# Altium schematic symbol library lib_datalogger.SchLib: 1246 symbols (part 8 of 16)
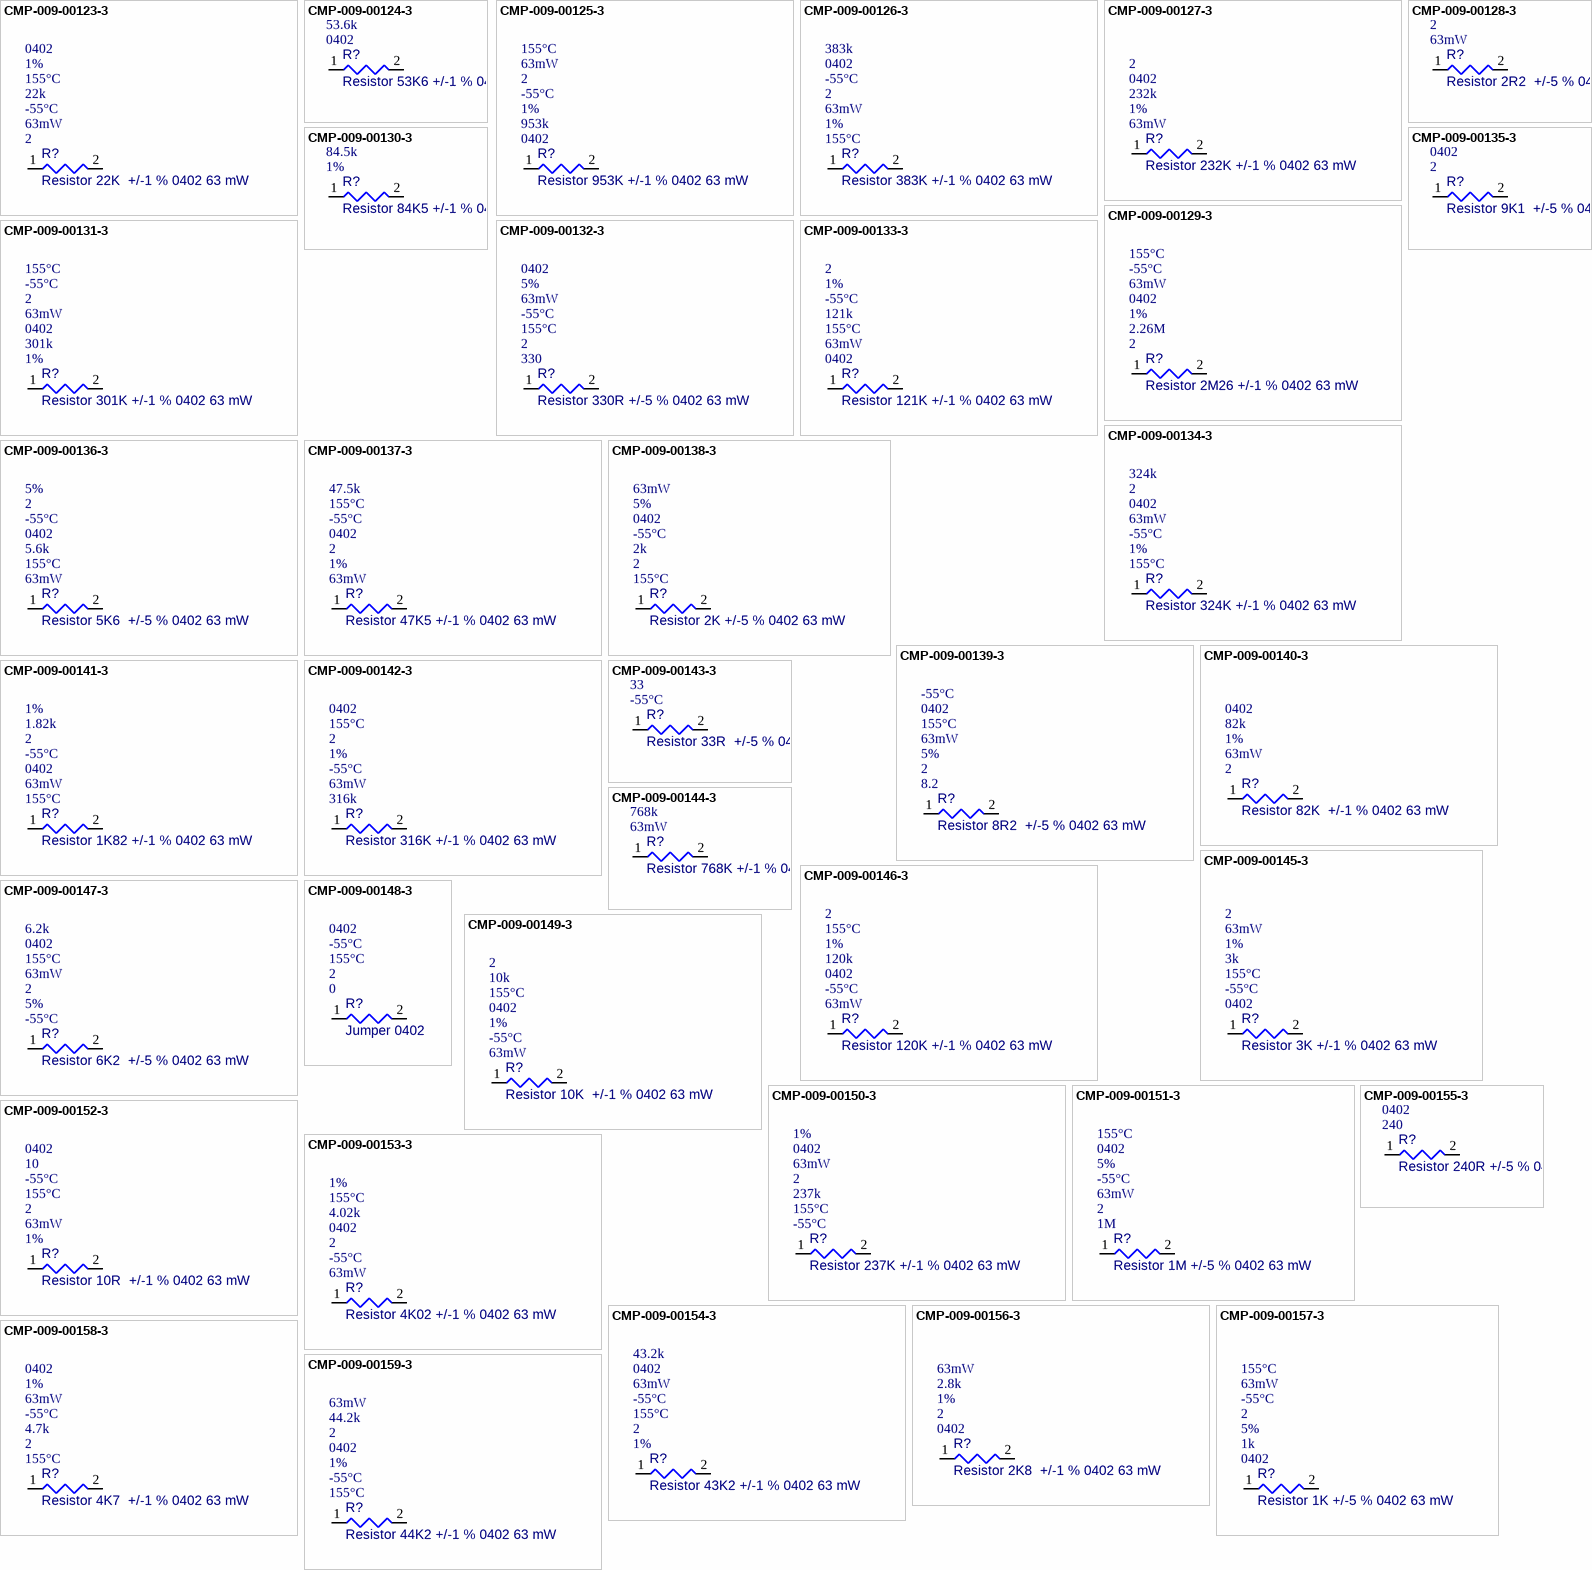
[diagram p50: symbols CMP-009-00123-3 to CMP-009-00159-3]

## CMP-009-00151-3
designator R?, comment Resistor 1M +/-5 % 0402 63 mW  value 1M  Pins: 2  Power: 63mW  Min Operating Temperature: -55°C  Tolerance: 5%  Case/Package: 0402  Max Operating Temperature: 155°C
Chip Resistor, 1 MOhms, +/-5 %, 63 mW, -55 to 155 degC, 0402
footprint RESC0805(2012)_L (Chip Resistor, Body 2.0x1.3mm, IPC High Density)
footprint RESC0402(1005)_L (Chip Resistor, Body 1.0x0.5mm, IPC High Density)
pins: 1, 2
1 alternate drawing of the same symbol

## CMP-009-00152-3
designator R?, comment Resistor 10R  +/-1 % 0402 63 mW  value 10  Tolerance: 1%  Power: 63mW  Pins: 2  Max Operating Temperature: 155°C  Min Operating Temperature: -55°C  Case/Package: 0402
Chip Resistor, 10 Ohms, +/-1 %, 63 mW, -55 to 155 degC, 0402
footprint RESC0805(2012)_L (Chip Resistor, Body 2.0x1.3mm, IPC High Density)
footprint RESC0402(1005)_L (Chip Resistor, Body 1.0x0.5mm, IPC High Density)
pins: 1, 2
1 alternate drawing of the same symbol

## CMP-009-00153-3
designator R?, comment Resistor 4K02 +/-1 % 0402 63 mW  value 4.02k  Power: 63mW  Min Operating Temperature: -55°C  Pins: 2  Case/Package: 0402  Max Operating Temperature: 155°C  Tolerance: 1%
Chip Resistor, 4,02 kOhms, +/-1 %, 63 mW, -55 to 155 degC, 0402
footprint RESC0805(2012)_L (Chip Resistor, Body 2.0x1.3mm, IPC High Density)
footprint RESC0402(1005)_L (Chip Resistor, Body 1.0x0.5mm, IPC High Density)
pins: 1, 2
1 alternate drawing of the same symbol

## CMP-009-00154-3
designator R?, comment Resistor 43K2 +/-1 % 0402 63 mW  value 43.2k  Tolerance: 1%  Pins: 2  Max Operating Temperature: 155°C  Min Operating Temperature: -55°C  Power: 63mW  Case/Package: 0402
Chip Resistor, 43,2 kOhms, +/-1 %, 63 mW, -55 to 155 degC, 0402
footprint RESC0805(2012)_L (Chip Resistor, Body 2.0x1.3mm, IPC High Density)
footprint RESC0402(1005)_L (Chip Resistor, Body 1.0x0.5mm, IPC High Density)
pins: 1, 2
1 alternate drawing of the same symbol

## CMP-009-00155-3
designator R?, comment Resistor 240R +/-5 % 0402 63 mW  value 240  Case/Package: 0402  Pins: 2  Max Operating Temperature: 155°C  Min Operating Temperature: -55°C  Power: 63mW  Tolerance: 5%
Chip Resistor, 240 Ohms, +/-5 %, 63 mW, -55 to 155 degC, 0402
footprint RESC0805(2012)_L (Chip Resistor, Body 2.0x1.3mm, IPC High Density)
footprint RESC0402(1005)_L (Chip Resistor, Body 1.0x0.5mm, IPC High Density)
pins: 1, 2
1 alternate drawing of the same symbol

## CMP-009-00156-3
designator R?, comment Resistor 2K8  +/-1 % 0402 63 mW  value 2.8k  Case/Package: 0402  Pins: 2  Tolerance: 1%  Power: 63mW
Chip Resistor, 2,8 kOhms, +/-1 %, 63 mW, -55 to 155 degC, 0402
footprint RESC0805(2012)_L (Chip Resistor, Body 2.0x1.3mm, IPC High Density)
footprint RESC0402(1005)_L (Chip Resistor, Body 1.0x0.5mm, IPC High Density)
pins: 1, 2
1 alternate drawing of the same symbol

## CMP-009-00157-3
designator R?, comment Resistor 1K +/-5 % 0402 63 mW  value 1k  Case/Package: 0402  Tolerance: 5%  Pins: 2  Min Operating Temperature: -55°C  Power: 63mW  Max Operating Temperature: 155°C
Chip Resistor, 1 kOhms, +/-5 %, 63 mW, -55 to 155 degC, 0402
footprint RESC0805(2012)_L (Chip Resistor, Body 2.0x1.3mm, IPC High Density)
footprint RESC0402(1005)_L (Chip Resistor, Body 1.0x0.5mm, IPC High Density)
pins: 1, 2
1 alternate drawing of the same symbol

## CMP-009-00158-3
designator R?, comment Resistor 4K7  +/-1 % 0402 63 mW  value 4.7k  Max Operating Temperature: 155°C  Pins: 2  Min Operating Temperature: -55°C  Power: 63mW  Tolerance: 1%  Case/Package: 0402
Chip Resistor, 4,7 kOhms, +/-1 %, 63 mW, -55 to 155 degC, 0402
footprint RESC0805(2012)_L (Chip Resistor, Body 2.0x1.3mm, IPC High Density)
footprint RESC0402(1005)_L (Chip Resistor, Body 1.0x0.5mm, IPC High Density)
pins: 1, 2
1 alternate drawing of the same symbol

## CMP-009-00159-3
designator R?, comment Resistor 44K2 +/-1 % 0402 63 mW  value 44.2k  Max Operating Temperature: 155°C  Min Operating Temperature: -55°C  Tolerance: 1%  Case/Package: 0402  Pins: 2  Power: 63mW
Chip Resistor, 44,2 kOhms, +/-1 %, 63 mW, -55 to 155 degC, 0402
footprint RESC0805(2012)_L (Chip Resistor, Body 2.0x1.3mm, IPC High Density)
footprint RESC0402(1005)_L (Chip Resistor, Body 1.0x0.5mm, IPC High Density)
pins: 1, 2
1 alternate drawing of the same symbol

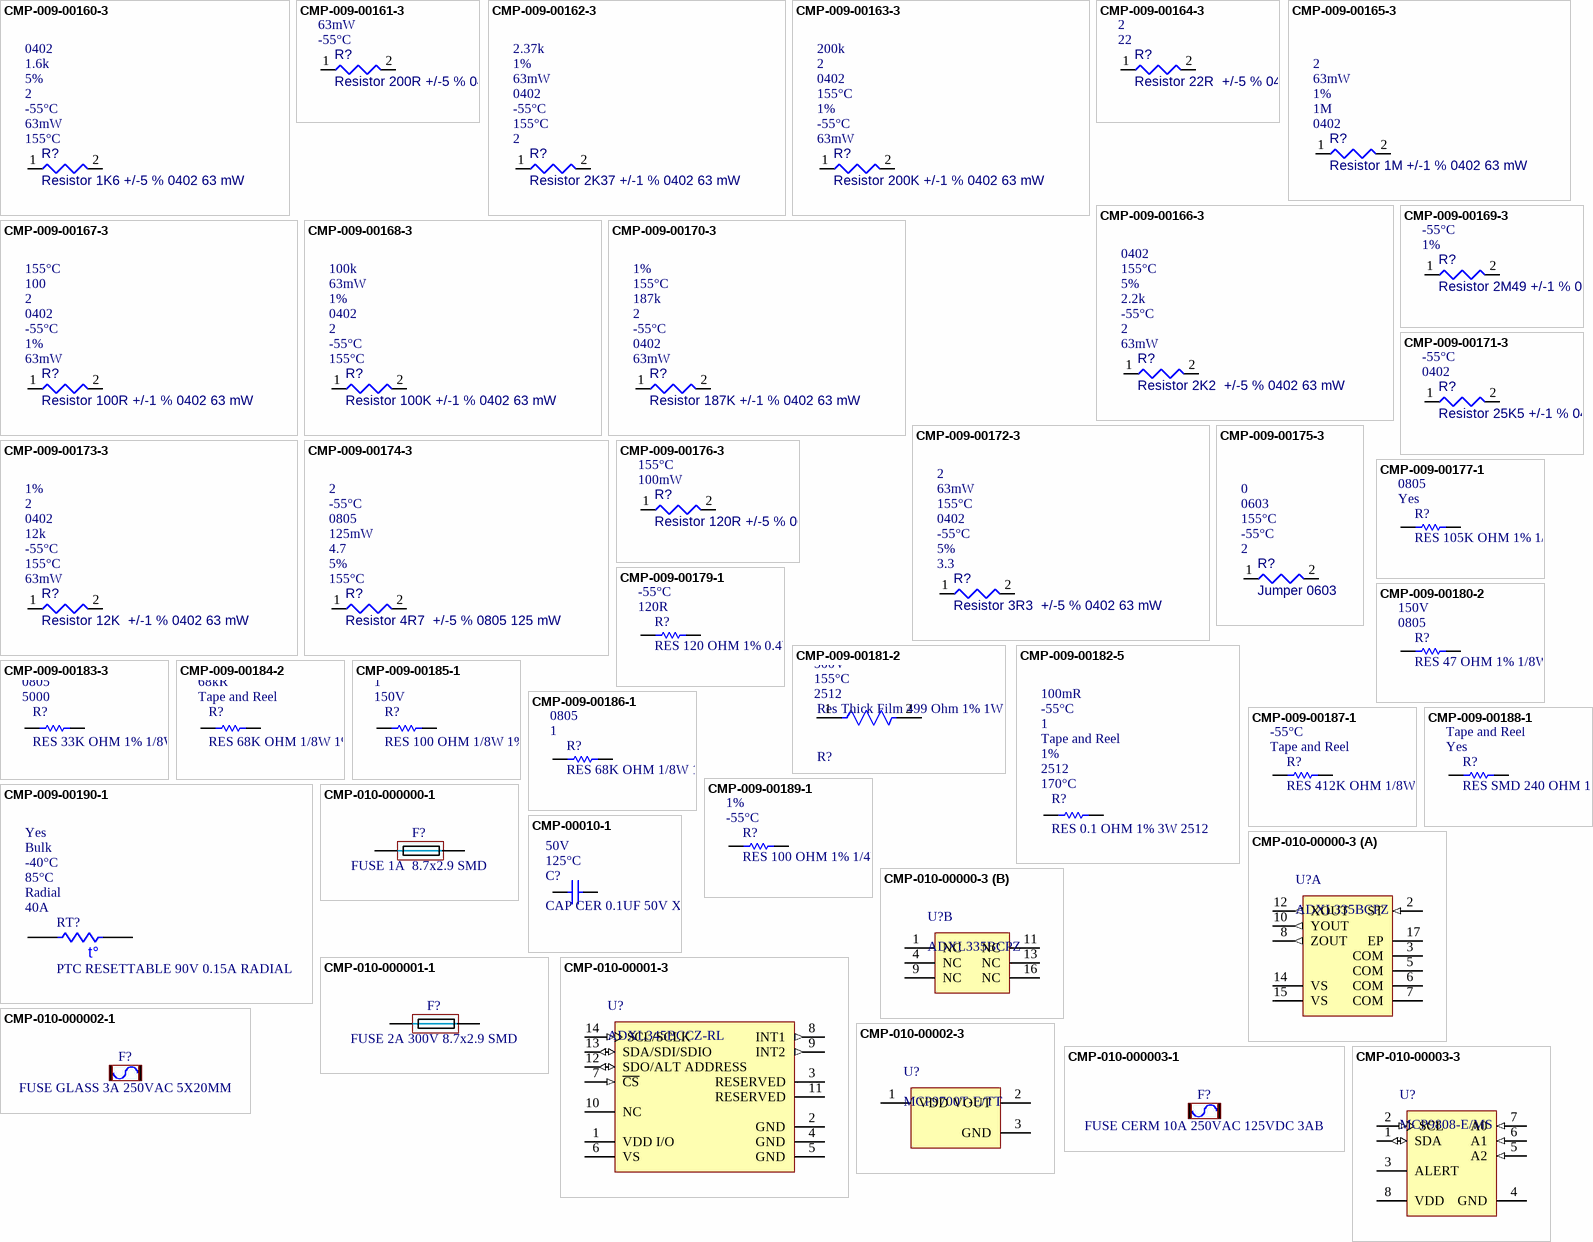
[diagram p21: symbols CMP-009-00160-3 to CMP-010-00003-3]

## CMP-009-00160-3
designator R?, comment Resistor 1K6 +/-5 % 0402 63 mW  value 1.6k  Max Operating Temperature: 155°C  Power: 63mW  Min Operating Temperature: -55°C  Pins: 2  Tolerance: 5%  Case/Package: 0402
Chip Resistor, 1,6 kOhms, +/-5 %, 63 mW, -55 to 155 degC, 0402
footprint RESC0805(2012)_L (Chip Resistor, Body 2.0x1.3mm, IPC High Density)
footprint RESC0402(1005)_L (Chip Resistor, Body 1.0x0.5mm, IPC High Density)
pins: 1, 2
1 alternate drawing of the same symbol

## CMP-009-00161-3
designator R?, comment Resistor 200R +/-5 % 0402 63 mW  value 200  Min Operating Temperature: -55°C  Power: 63mW  Tolerance: 5%  Case/Package: 0402  Max Operating Temperature: 155°C  Pins: 2
Chip Resistor, 200 Ohms, +/-5 %, 63 mW, -55 to 155 degC, 0402
footprint RESC0805(2012)_L (Chip Resistor, Body 2.0x1.3mm, IPC High Density)
footprint RESC0402(1005)_L (Chip Resistor, Body 1.0x0.5mm, IPC High Density)
pins: 1, 2
1 alternate drawing of the same symbol

## CMP-009-00162-3
designator R?, comment Resistor 2K37 +/-1 % 0402 63 mW  value 2.37k  Pins: 2  Max Operating Temperature: 155°C  Min Operating Temperature: -55°C  Case/Package: 0402  Power: 63mW  Tolerance: 1%
Chip Resistor, 2,37 kOhms, +/-1 %, 63 mW, -55 to 155 degC, 0402
footprint RESC0805(2012)_L (Chip Resistor, Body 2.0x1.3mm, IPC High Density)
footprint RESC0402(1005)_L (Chip Resistor, Body 1.0x0.5mm, IPC High Density)
pins: 1, 2
1 alternate drawing of the same symbol

## CMP-009-00163-3
designator R?, comment Resistor 200K +/-1 % 0402 63 mW  value 200k  Power: 63mW  Min Operating Temperature: -55°C  Tolerance: 1%  Max Operating Temperature: 155°C  Case/Package: 0402  Pins: 2
Chip Resistor, 200 kOhms, +/-1 %, 63 mW, -55 to 155 degC, 0402
footprint RESC0805(2012)_L (Chip Resistor, Body 2.0x1.3mm, IPC High Density)
footprint RESC0402(1005)_L (Chip Resistor, Body 1.0x0.5mm, IPC High Density)
pins: 1, 2
1 alternate drawing of the same symbol

## CMP-009-00164-3
designator R?, comment Resistor 22R  +/-5 % 0402 63 mW  value 22  Pins: 2  Min Operating Temperature: -55°C  Max Operating Temperature: 155°C  Case/Package: 0402  Tolerance: 5%  Power: 63mW
Chip Resistor, 22 Ohms, +/-5 %, 63 mW, -55 to 155 degC, 0402
footprint RESC0805(2012)_L (Chip Resistor, Body 2.0x1.3mm, IPC High Density)
footprint RESC0402(1005)_L (Chip Resistor, Body 1.0x0.5mm, IPC High Density)
pins: 1, 2
1 alternate drawing of the same symbol

## CMP-009-00165-3
designator R?, comment Resistor 1M +/-1 % 0402 63 mW  value 1M  Case/Package: 0402  Tolerance: 1%  Power: 63mW  Pins: 2
Chip Resistor, 1 MOhms, +/-1 %, 63 mW, -55 to 155 degC, 0402
footprint RESC0805(2012)_L (Chip Resistor, Body 2.0x1.3mm, IPC High Density)
footprint RESC0402(1005)_L (Chip Resistor, Body 1.0x0.5mm, IPC High Density)
pins: 1, 2
1 alternate drawing of the same symbol

## CMP-009-00166-3
designator R?, comment Resistor 2K2  +/-5 % 0402 63 mW  value 2.2k  Power: 63mW  Pins: 2  Min Operating Temperature: -55°C  Tolerance: 5%  Max Operating Temperature: 155°C  Case/Package: 0402
Chip Resistor, 2,2 kOhms, +/-5 %, 63 mW, -55 to 155 degC, 0402
footprint RESC0805(2012)_L (Chip Resistor, Body 2.0x1.3mm, IPC High Density)
footprint RESC0402(1005)_L (Chip Resistor, Body 1.0x0.5mm, IPC High Density)
pins: 1, 2
1 alternate drawing of the same symbol

## CMP-009-00167-3
designator R?, comment Resistor 100R +/-1 % 0402 63 mW  value 100  Power: 63mW  Tolerance: 1%  Min Operating Temperature: -55°C  Case/Package: 0402  Pins: 2  Max Operating Temperature: 155°C
Chip Resistor, 100 Ohms, +/-1 %, 63 mW, -55 to 155 degC, 0402
footprint RESC0805(2012)_L (Chip Resistor, Body 2.0x1.3mm, IPC High Density)
footprint RESC0402(1005)_L (Chip Resistor, Body 1.0x0.5mm, IPC High Density)
pins: 1, 2
1 alternate drawing of the same symbol

## CMP-009-00168-3
designator R?, comment Resistor 100K +/-1 % 0402 63 mW  value 100k  Max Operating Temperature: 155°C  Min Operating Temperature: -55°C  Pins: 2  Case/Package: 0402  Tolerance: 1%  Power: 63mW
Chip Resistor, 100 kOhms, +/-1 %, 63 mW, -55 to 155 degC, 0402
footprint RESC0805(2012)_L (Chip Resistor, Body 2.0x1.3mm, IPC High Density)
footprint RESC0402(1005)_L (Chip Resistor, Body 1.0x0.5mm, IPC High Density)
pins: 1, 2
1 alternate drawing of the same symbol

## CMP-009-00169-3
designator R?, comment Resistor 2M49 +/-1 % 0402 63 mW  value 2.49M  Tolerance: 1%  Min Operating Temperature: -55°C  Max Operating Temperature: 155°C  Pins: 2  Power: 63mW  Case/Package: 0402
Chip Resistor, 2,49 MOhms, +/-1 %, 63 mW, -55 to 155 degC, 0402
footprint RESC0805(2012)_L (Chip Resistor, Body 2.0x1.3mm, IPC High Density)
footprint RESC0402(1005)_L (Chip Resistor, Body 1.0x0.5mm, IPC High Density)
pins: 1, 2
1 alternate drawing of the same symbol

## CMP-009-00170-3
designator R?, comment Resistor 187K +/-1 % 0402 63 mW  value 187k  Power: 63mW  Case/Package: 0402  Min Operating Temperature: -55°C  Pins: 2  Max Operating Temperature: 155°C  Tolerance: 1%
Chip Resistor, 187 kOhms, +/-1 %, 63 mW, -55 to 155 degC, 0402
footprint RESC0805(2012)_L (Chip Resistor, Body 2.0x1.3mm, IPC High Density)
footprint RESC0402(1005)_L (Chip Resistor, Body 1.0x0.5mm, IPC High Density)
pins: 1, 2
1 alternate drawing of the same symbol

## CMP-009-00171-3
designator R?, comment Resistor 25K5 +/-1 % 0402 63 mW  value 25.5k  Case/Package: 0402  Min Operating Temperature: -55°C  Max Operating Temperature: 155°C  Tolerance: 1%  Pins: 2  Power: 63mW
Chip Resistor, 25,5 kOhms, +/-1 %, 63 mW, -55 to 155 degC, 0402
footprint RESC0805(2012)_L (Chip Resistor, Body 2.0x1.3mm, IPC High Density)
footprint RESC0402(1005)_L (Chip Resistor, Body 1.0x0.5mm, IPC High Density)
pins: 1, 2
1 alternate drawing of the same symbol

## CMP-009-00172-3
designator R?, comment Resistor 3R3  +/-5 % 0402 63 mW  value 3.3  Tolerance: 5%  Min Operating Temperature: -55°C  Case/Package: 0402  Max Operating Temperature: 155°C  Power: 63mW  Pins: 2
Chip Resistor, 3,3 Ohms, +/-5 %, 63 mW, -55 to 155 degC, 0402
footprint RESC0805(2012)_L (Chip Resistor, Body 2.0x1.3mm, IPC High Density)
footprint RESC0402(1005)_L (Chip Resistor, Body 1.0x0.5mm, IPC High Density)
pins: 1, 2
1 alternate drawing of the same symbol

## CMP-009-00173-3
designator R?, comment Resistor 12K  +/-1 % 0402 63 mW  value 12k  Power: 63mW  Max Operating Temperature: 155°C  Min Operating Temperature: -55°C  Case/Package: 0402  Pins: 2  Tolerance: 1%
Chip Resistor, 12 kOhms, +/-1 %, 63 mW, -55 to 155 degC, 0402
footprint RESC0805(2012)_L (Chip Resistor, Body 2.0x1.3mm, IPC High Density)
footprint RESC0402(1005)_L (Chip Resistor, Body 1.0x0.5mm, IPC High Density)
pins: 1, 2
1 alternate drawing of the same symbol

## CMP-009-00174-3
designator R?, comment Resistor 4R7  +/-5 % 0805 125 mW  value 4.7  Max Operating Temperature: 155°C  Tolerance: 5%  Power: 125mW  Case/Package: 0805  Min Operating Temperature: -55°C  Pins: 2
Chip Resistor, 4,7 Ohms, +/-5 %, 125 mW, -55 to 155 degC, 0805
footprint RESC0805(2012)_L (Chip Resistor, Body 2.0x1.3mm, IPC High Density)
footprint RESC0805(2012)_L-4 (Chip Resistor, Body 2.0x1.3mm, IPC High Density)
pins: 1, 2
1 alternate drawing of the same symbol

## CMP-009-00175-3
designator R?, comment Jumper 0603  value 0  Pins: 2  Min Operating Temperature: -55°C  Max Operating Temperature: 155°C  Case/Package: 0603
footprint RESC0805(2012)_L (Chip Resistor, Body 2.0x1.3mm, IPC High Density)
footprint RESC0603(1608)_L (Chip Resistor, Body 1.6x0.8mm, IPC High Density)
pins: 1, 2
1 alternate drawing of the same symbol

## CMP-009-00176-3
designator R?, comment Resistor 120R +/-5 % 0603 0.1 W  value 120  Power: 100mW  Max Operating Temperature: 155°C  Pins: 2  Tolerance: 5%  Case/Package: 0603  Min Operating Temperature: -55°C
Chip Resistor, 120 Ohms, +/-5 %, 0.1 W, -55 to 155 degC, 0603
footprint RESC0805(2012)_L (Chip Resistor, Body 2.0x1.3mm, IPC High Density)
footprint RESC0603(1608)_L (Chip Resistor, Body 1.6x0.8mm, IPC High Density)
pins: 1, 2
1 alternate drawing of the same symbol

## CMP-009-00177-1
designator R?, comment RES 105K OHM 1% 1/8W 0805  RoHS Compliant: Yes  Case/Package: 0805  Resistance: 105kR  Voltage Rating: 150V  Tolerance: 1%  Package Quantity: 1  Packaging: Tape and Reel  Min Operating Temperature: -55°C  Max Operating Temperature: 155°C
105 kOhms ±1% 0.125W, 1/8W Chip Resistor 0805; Temperature Coefficient: 100ppm/°C; Max Power Dissipation: 125mW; Case Code (Metric): 2012; Series: RC; Number of Terminations: 2; Voltage Rating (DC): 150V; Depth: 1.25mm; Width: 1.25mm; Resistor Type: Thick Film; Lead Free: Lead Free; Size Code: 0805; Length: 2mm; Termination: SMD/SMT; Power Rating: 125mW; Military Standard: Not; Height: 0.024inch; Radiation Hardening: No
footprint RESC2013X60X35ML10T20 (Chip Resistor, 2-Leads, Body 2.00x1.25mm, IPC Low Density)
pins: 1, 2
1 alternate drawing of the same symbol

## CMP-009-00179-1
designator R?, comment RES 120 OHM 1% 0.4W 0805 SMD  Resistance: 120R  Min Operating Temperature: -55°C  RoHS Compliant: Yes  Tolerance: 1%  Packaging: Tape and Reel  Case/Package: 0805  Max Operating Temperature: 155°C  Package Quantity: 1
Res 120 Ohm 1% 0.4W Thick Film 0805 ±100ppm/C Epoxy Resin Pad SMD Automotive T/R; Manufacturer Part Number: ESR10EZPF1200; Power Rating: 400mW; Temperature Coefficient: 100ppm/°C; Height: 0.026inch; Resistor Type: Thick Film; Case Code (Metric): 2012; Lead Free: Lead Free; Case Code (Imperial): 0805; Width: 0.049inch; Max Power Dissipation: 400mW; Series: ESR; Length: 0.079inch; Number of Terminations: 2; Features: Automotive AEC-Q200
footprint CR2012-0805 (Chip Capacitor)
pins: 1, 2
1 alternate drawing of the same symbol

## CMP-009-00180-2
designator R?, comment RES 47 OHM 1% 1/8W 0805 SMD  Case/Package: 0805  Voltage Rating: 150V  Resistance: 47R  Package Quantity: 1  Packaging: Tape and Reel  Max Operating Temperature: 155°C  Min Operating Temperature: -55°C  RoHS Compliant: Yes  Tolerance: 1%
RES SMD 47 OHM 1% 1/8W 0805 RC0805FR-0747RL; Temperature Coefficient: 100ppm/°C; Power Rating: 125mW; Military Standard: Not; Resistance Tolerance: 1%; Case Code (Imperial): 0805; Number of Terminations: 2; Features: Moisture Resistant; Height: 0.024inch; REACH SVHC: Unknown; Resistor Type: Thick Film; Length: 2mm; Lead Free: Lead Free; Technology: THICK FILM; Construction: Rectangular; Termination: SMD/SMT; Series: RC; Size Code: 0805; Max Power Dissipation: 125mW; Width: 0.049inch; Case Code (Metric): 2012; Manufacturer Part Number: RC0805FR-0747RL; Depth: 1.25mm
footprint CR2012-0805 (Chip Capacitor)
pins: 1, 2
1 alternate drawing of the same symbol

## CMP-009-00181-2
designator R?, comment Res Thick Film 499 Ohm 1% 1W 2512 SMD  Case/Package: 2512  Max Operating Temperature: 155°C  Voltage Rating: 500V  Packaging: Tape and Reel  Min Operating Temperature: -55°C  Package Quantity: 2000  Resistance: 499R  Tolerance: 1%  RoHS Compliant: Yes
Res Thick Film 2512 499 Ohm 1% 1W ±100ppm/°C Molded SMD SMD Blister T/R; Manufacturer Part Number: CRCW2512499RFKEG; Mount: Surface Mount; Termination: SMD/SMT; Length: 6.3mm; Features: Automotive AEC-Q200; Construction: Rectangular; Resistance Tolerance: 1%; Voltage Rating (DC): 500V; Case Code (Metric): 6432; Contact Plating: Tin; Power Rating: 1W; Case Code (Imperial): 2512; Lead Free: Lead Free; Height: 0.028inch; Depth: 3.15mm; Series: CRCW; Military Standard: Not; Number of Terminations: 2; Number of Pins: 2; Temperature Coefficient: 100ppm/°C; Size Code: 2512; Weight: 0.001429oz; Resistor Type: Thick Film; Width: 3.15mm; REACH SVHC: No SVHC; Max Power Dissipation: 1W; Radiation Hardening: No
footprint FP-CRCW2512-e3-IPC_C
footprint FP-CRCW2512-e3-MFG
footprint FP-CRCW2512-e3-IPC_B
footprint FP-CRCW2512-e3-IPC_A
pins: 1, 2

## CMP-009-00182-5
designator R?, comment RES 0.1 OHM 1% 3W 2512  Max Operating Temperature: 170°C  Case/Package: 2512  Tolerance: 1%  Packaging: Tape and Reel  Package Quantity: 1  Min Operating Temperature: -55°C  Resistance: 100mR
RES 0.1 OHM 1% 3W 2512 SMD Power Resistors +/- 75PPM; Manufacturer Part Number: CRA2512FZR100ELF; Temperature Coefficient: 75ppm/°C; Case Code (Imperial): 2512; Radiation Hardening: No; Construction: Rectangular; Features: Moisture Resistant; Power Rating: 3W; Number of Terminations: 2; Length: 6.4mm; Mount: Surface Mount; Resistance Tolerance: 1%; Max Power Dissipation: 3W; Depth: 3.35mm; Military Standard: Not; Termination: SMD/SMT; Height: 0.6mm; Case Code (Metric): 6432; REACH SVHC: No SVHC; Contact Plating: Tin; Width: 3.2mm; Resistor Type: Metal Film; Series: CRA2512; Number of Pins: 2
footprint FP-CRCW2512-e3-MFG
pins: 1, 2

## CMP-009-00183-3
designator R?, comment RES 33K OHM 1% 1/8W 0805 SMD  Package Quantity: 5000  Case/Package: 0805  Max Operating Temperature: 155°C  Tolerance: 1%  Packaging: Tape and Reel  RoHS Compliant: Yes  Resistance: 33kR  Min Operating Temperature: -55°C
Manufacturer Part Number: MCR10EZHF3302; Temperature Coefficient: 100ppm/°C; Power Rating: 125mW; Voltage Rating (DC): 150V; Width: 0.049inch; Case Code (Metric): 2012; Size Code: 0805; Case Code (Imperial): 0805; Height: 0.024inch; Lead Free: Lead Free; Max Power Dissipation: 125mW; Mount: Surface Mount; Resistor Type: Thick Film; Length: 0.079inch; Series: MCR10; Number of Terminations: 2
footprint CR2012-0805 (Chip Capacitor)
pins: 1, 2

## CMP-009-00184-2
designator R?, comment RES 68K OHM 1/8W 1% 0805 SMD  Packaging: Tape and Reel  Resistance: 68kR  Tolerance: 1%  Min Operating Temperature: -55°C  Package Quantity: 1  Voltage Rating: 150V  Case/Package: 0805  RoHS Compliant: Yes  Max Operating Temperature: 155°C
Manufacturer Part Number: ERJ-6ENF6802V; Power Rating: 125mW; Temperature Coefficient: 100ppm/°C; REACH SVHC: No SVHC; Max Power Dissipation: 125mW; Features: Automotive AEC-Q200; Mount: Surface Mount; Case Code (Imperial): 0805; Contact Plating: Tin; Height: 0.6mm; Military Standard: Not; Depth: 1.25mm; Series: ERJ; Radiation Hardening: No; Resistor Type: Thick Film; Construction: Rectangular; Number of Terminations: 2; Technology: THICK FILM; Length: 2mm; Number of Pins: 2; Termination: SMD/SMT; Width: 1.2mm; Resistance Tolerance: 1%; Voltage Rating (DC): 150V; Lead Free: Lead Free; Case Code (Metric): 2012
footprint CR2012-0805 (Chip Capacitor)
pins: 1, 2

## CMP-009-00185-1
designator R?, comment RES 100 OHM 1/8W 1% 0805 SMD  Voltage Rating: 150V  Package Quantity: 1  Tolerance: 1%  Packaging: Tape and Reel  Min Operating Temperature: -55°C  Resistance: 100R  Case/Package: 0805  Max Operating Temperature: 155°C  RoHS Compliant: Yes
Manufacturer Part Number: ERJ-6ENF1000V; Temperature Coefficient: 100ppm/°C; Max Power Dissipation: 125mW; Size Code: 0805; Termination: SMD/SMT; Number of Terminations: 2; REACH SVHC: No SVHC; Features: Automotive AEC-Q200; Length: 2mm; Width: 1.2mm; Series: ERJ; Construction: Rectangular; Case Code (Metric): 2012; Number of Pins: 2; Power Rating: 125mW; Height: 0.6mm; Military Standard: Not; Mount: Surface Mount; Radiation Hardening: No; Voltage Rating (DC): 150V; Depth: 1.25mm; Resistor Type: Thick Film; Case Code (Imperial): 0805; Lead Free: Lead Free; Resistance Tolerance: 1%; Technology: THICK FILM; Contact Plating: Tin
footprint CR2012-0805 (Chip Capacitor)
pins: 1, 2

## CMP-009-00186-1
designator R?, comment RES 68K OHM 1/8W 1% 0805 SMD  Package Quantity: 1  Case/Package: 0805  Max Operating Temperature: 155°C  Min Operating Temperature: -55°C  Tolerance: 1%  Packaging: Tape and Reel  Voltage Rating: 150V  RoHS Compliant: Yes  Resistance: 68kR
Manufacturer Part Number: ERJ-6ENF6802V; Temperature Coefficient: 100ppm/°C; Max Power Dissipation: 125mW; Case Code (Metric): 2012; Contact Plating: Tin; Mount: Surface Mount; Voltage Rating (DC): 150V; Features: Automotive AEC-Q200; Resistance Tolerance: 1%; Radiation Hardening: No; Lead Free: Lead Free; Military Standard: Not; Number of Pins: 2; REACH SVHC: No SVHC; Case Code (Imperial): 0805; Length: 2mm; Resistor Type: Thick Film; Number of Terminations: 2; Power Rating: 125mW; Termination: SMD/SMT; Technology: THICK FILM; Series: ERJ; Depth: 1.25mm; Height: 0.6mm; Width: 1.2mm; Construction: Rectangular
footprint CR2012-0805 (Chip Capacitor)
pins: 1, 2
1 alternate drawing of the same symbol

## CMP-009-00187-1
designator R?, comment RES 412K OHM 1/8W 1% 0805 SMD  Packaging: Tape and Reel  Min Operating Temperature: -55°C  Package Quantity: 1  Resistance: 412kR  Max Operating Temperature: 155°C  Tolerance: 1%  Voltage Rating: 150V  Case/Package: 0805  RoHS Compliant: Yes
Manufacturer Part Number: ERJ-6ENF4123V; Temperature Coefficient: 100ppm/°C; Power Rating: 125mW; Voltage Rating (DC): 150V; Military Standard: Not; Width: 0.049inch; Resistance Tolerance: 1%; Mount: Surface Mount; Resistor Type: Thick Film; Series: ERJ; Case Code (Metric): 2012; Features: Automotive AEC-Q200; Contact Plating: Tin; Case Code (Imperial): 0805; Length: 2mm; Height: 0.028inch; Depth: 1.25mm; Number of Terminations: 2; Max Power Dissipation: 125mW; REACH SVHC: Yes; Construction: Rectangular
footprint CR2012-0805 (Chip Capacitor)
pins: 1, 2
1 alternate drawing of the same symbol

## CMP-009-00188-1
designator R?, comment RES SMD 240 OHM 1% 1/8W 0805  RoHS Compliant: Yes  Packaging: Tape and Reel  Resistance: 240R  Min Operating Temperature: -55°C  Case/Package: 0805  Package Quantity: 5000  Tolerance: 1%  Max Operating Temperature: 155°C
Manufacturer Part Number: MCR10EZPF2400; Max Power Dissipation: 125mW; Temperature Coefficient: 100ppm/°C; Voltage Rating (DC): 150V; Length: 0.079inch; Resistor Type: Thick Film; Features: Automotive AEC-Q200; Case Code (Metric): 2012; Number of Terminations: 2; Case Code (Imperial): 0805; Series: MCR10; Width: 0.049inch; Lead Free: Lead Free; Height: 0.024inch
footprint CR2012-0805 (Chip Capacitor)
pins: 1, 2
1 alternate drawing of the same symbol

## CMP-009-00189-1
designator R?, comment RES 100 OHM 1% 1/4W 1206 SMD  Min Operating Temperature: -55°C  Tolerance: 1%  Package Quantity: 1  Packaging: Tape and Reel  Max Operating Temperature: 155°C  Voltage Rating: 200V  Case/Package: 1206  Resistance: 100R  RoHS Compliant: Yes
Manufacturer Part Number: ERJ-8ENF1000V; Temperature Coefficient: 100ppm/°C; Max Power Dissipation: 250mW; Contact Plating: Tin; Depth: 1.6mm; Mount: Surface Mount; Series: ERJ; Case Code (Metric): 3216; Termination: SMD/SMT; Resistor Type: Thick Film; Voltage Rating (DC): 200V; Radiation Hardening: No; Power Rating: 250mW; Case Code (Imperial): 1206; Width: 0.063inch; REACH SVHC: No SVHC; Technology: THICK FILM; Number of Terminations: 2; Length: 3.2mm; Height: 0.6mm; Working Voltage: 200V; Construction: Rectangular; Resistance Tolerance: 1%; Number of Pins: 2; Military Standard: Not; Lead Free: Lead Free; Features: Automotive AEC-Q200
footprint CR3216-1206 (Chip Capacitor; Body 3.2 x 1.6 mm (LxW typ))
pins: 1, 2
1 alternate drawing of the same symbol

## CMP-009-00190-1
designator RT?, comment PTC RESETTABLE 90V 0.15A RADIAL  Max Current Rating: 40A  Case/Package: Radial  Max Operating Temperature: 85°C  Min Operating Temperature: -40°C  Packaging: Bulk  RoHS Compliant: Yes
Manufacturer: Bel Fuse Inc.; Manufacturer Part Number: 0ZRC0015FF1E; Current - Hold (Ih) (Max): 150mA; Current - Trip (It): 350mA; R Min/Max: 2.400 ~ 5.500 Ohm; Time to Trip: 3s; Lead Diameter: 0.51mm; Approvals: UL,TUV; Number of Terminals/Pins: 2; Supplier 1: Digi-Key; RoHS: RoHS Compliant; Category: Circuit Protection; Stock 1: 2900; Pricing 1: 1=0.21, 5=0.206, 10=0.197, 50=0.1754, 100=0.1634, 250=0.1452, 500=0.121, 1000=0.11495, 5000=0.09075 (USD); Part Status: Active; Voltage - Max: 90V; Current - Max: 40A; Mounting Type: Through Hole; Package / Case: Radial, Disc; Size / Dimension: 0.291" L x 0.122" W (7.40mm x 3.10mm); Height - Seated (Max): 0.500" (12.70mm); Thickness (Max): -; Lead Spacing: 0.201" (5.10mm); ComponentLink1URL: http://belfuse.com/pdfs/0ZRC.pdf; ComponentLink1Description: http://belfuse.com/pdfs/0ZRC.pdf; Supplier Part Number 1: 507-1329-ND; Voltage: 90V; Contact Plating: Tin; Hold Current: 150mA; Number of Pins: 2; Mount: Through Hole; Terminal Pitch: 5.1mm; Trip Current: 350mA; Series: 0ZRC
footprint PTC_TH (Jumper Wire; 2 Leads)
footprint New footprint 1
pins: 1, 2
text: t°

## CMP-010-000000-1
designator F?, comment FUSE 1A  8.7x2.9 SMD
SMD Ceramic Fuse Delayed blow/Slow Blow 2A 300mV 50A/100A 7.8 SMD Surface Mount Fuses RoHS; Manufacturer Part Number 1: JFC2410-1100TS; Manufacturer 1: Cooper Bussmann; eVendorPrice: 0.0485; eVendor#: C136380; eVendor: LCSC; Design Item ID: FUSE 1A  8.7x2.9 SMD; Source: mits.SchLib; Datasheet: http://www.cooperindustries.com/content/dam/public/bussmann/Electronics/Resources/product-datasheets/Bus_Elx_DS_2119_HTB_Series.pdf
footprint FUSE_HOLES
footprint FUSE 2.9X2.85 (Chip Capacitor)
pins: 1, 2

## CMP-010-00000-3
designator U?, comment ADXL335BCPZ
Small, Low Power, 3-Axis +/-3 g Accelerometer with Analog Output, 1.6 KHz BW, Industrial, 16-Pin QFN, Tray; Manufacturer: Analog Devices; Min Supply Voltage: 1.8V; Package Version: 051909-A, 05/2009; Max Supply Voltage: 3.6V; Sensor Type: Motion; Nominal Supply Current: 350µA; Package Description: 16-Pin Lead Frame Chip Scale Package, 4 x 4 mm Body, 0.65 mm Pitch; Min Operating Temperature: -40°C; Case/Package: PDIP; Datasheet Version: Rev. B, 01/2010; Package Quantity: 490; Package Reference: CP-16-14; Mounting Technology: SM; Packaging: Tray; Datasheet URL: http://www.analog.com/static/imported-files/data_sheets/ADXL335.pdf; Pins: 16; Max Operating Temperature: 85°C; RoHS Compliant: True
footprint ADI-CP-16-14_N (QFN, 16-Leads, Body 4.15x4.15mm, Pitch 0.65mm, Thermal Pad 2.4x2.4mm, IPC Medium Density)
footprint ADI-CP-16-14_L (QFN, 16-Leads, Body 4.15x4.15mm, Pitch 0.65mm, Thermal Pad 2.4x2.4mm, IPC High Density)
footprint ADI-CP-16-14_M (QFN, 16-Leads, Body 4.15x4.15mm, Pitch 0.65mm, Thermal Pad 2.4x2.4mm, IPC Low Density)
part A pins: 2 ST (in) "Self-Test.", 3 COM (power) "Common.", 5 COM (power) "Common.", 6 COM (power) "Common.", 7 COM (power) "Common.", 8 ZOUT (out) "Z Channel Output.", 10 YOUT (out) "Y Channel Output.", 12 XOUT (out) "X Channel Output.", 14 VS (power) "Supply Voltage (1.8 V to 3.6 V).", 15 VS (power) "Supply Voltage (1.8 V to 3.6 V).", 17 EP "Not internally connected. Solder for mechanical integrity."
part B pins: 1 NC "No Connect.", 4 NC "No Connect.", 9 NC "No Connect.", 11 NC "No Connect.", 13 NC "No Connect.", 16 NC "No Connect."

## CMP-00010-1
designator C?, comment CAP CER 0.1UF 50V X7R RADIAL  Max Operating Temperature: 125°C  Voltage Rating: 50V  RoHS Compliant: Yes  Packaging: Tape and Reel  Case/Package: Dipped  Diameter: 500um  Min Operating Temperature: -55°C  Lead Pitch: 2.5mm  Capacitance: 100nF  Tolerance: 10%  Package Quantity: 4000
K Series 100nF 50 V ±10 % Tolerance X7R Radial Multilayer Ceramic Capacitor; Lead Length: 30mm; Lead Diameter: 0.5mm; Lead/Base Style: Straight; Thickness: 2.6mm; Number of Pins: 2; Depth: 2.6mm; Lead Free: Lead Free; Weight: 0.005291oz; Contact Plating: Tin; Radiation Hardening: No; Termination: Radial; Construction: RADIAL; Voltage: 50V; REACH SVHC: Unknown; Dielectric: X7R; Height - Seated (Max): 0.22inch; Width: 0.098inch; Series: K; Voltage Rating (DC): 50V; Dielectric Material: Ceramic; Height: 4mm; Length: 4mm; Mount: Through Hole,PCB
footprint VISH-K104K15X7RF5TL2 (THD, 2-Leads, Body 4x2.6mm)
pins: 1, 2

## CMP-010-000001-1
designator F?, comment FUSE 2A 300V 8.7x2.9 SMD
SMD Ceramic Fuse Delayed blow/Slow Blow 2A 300mV 50A/100A 7.8 SMD Surface Mount Fuses RoHS; Manufacturer 1: Littelfuse; Manufacturer  Part Number 1: 0454002.MR; Part#: SCT2.0A; eVendor#: C312007; eVendor: LCSC; Supplier Unit Price 1: 0.245; Design Item ID: FUSE 2A 300V 8.7x2.9 SMD; Datasheet: http://www.cooperindustries.com/content/dam/public/bussmann/Electronics/Resources/product-datasheets/Bus_Elx_DS_2119_HTB_Series.pdf; Source: mits.SchLib
footprint FUSE_HOLES
footprint FUSE 2.9X2.85 (Chip Capacitor)
pins: 1, 2

## CMP-010-00001-3
designator U?, comment ADXL345BCCZ-RL
3-Axis, +/-2 g / +/-4 g / +/-8 g / +/-16 g Digital Accelerometer with Digital Output, 1.6 KHz BW, -40 to 85 degC, 14-Pin LGA, Reel; Manufacturer: Analog Devices; Max Supply Voltage: 3.6V; Interface: Serial; Sensor Type: Motion; Nominal Supply Voltage: 2.5V; Min Supply Voltage: 2V; Nominal Supply Current: 140µA; Package Version: 03-16-2010-A, 03/2010; RoHS Compliant: True; Packaging: TapeandReel; Max Operating Temperature: 85°C; Min Operating Temperature: -40°C; Package Description: 14-Pin Land Grid Array, 3 x 5 mm Body, 0.8 mm Pitch; Datasheet Version: Rev. E, 06/2015; Case/Package: LGA; Pins: 14; Mounting Technology: SM; Package Quantity: 5000; Package Reference: CC-14-1; Datasheet URL: http://www.analog.com/static/imported-files/data_sheets/ADXL345.pdf
footprint ADI-CC-14-1_V (LGA, 14-Leads, Body 5x3mm, Pitch 0.8mm)
pins: 1 VDD I/O (power) "Digital Interface Supply Voltage.", 2 GND (power) "This pin must be connected to ground.", 3 RESERVED "Reserved. This pin must be connected to VS or left open.", 4 GND (power) "This pin must be connected to ground.", 5 GND (power) "This pin must be connected to ground.", 6 VS (power) "Supply Voltage.", 7 ~{CS} (in) "Chip Select.", 8 INT1 (out) "Interrupt 1 Output.", 9 INT2 (out) "Interrupt 2 Output.", 10 NC "Not Internally Connected.", 11 RESERVED "Reserved. This pin must be connected to ground or left open.", 12 SDO/ALT ADDRESS (io) "Serial Data Output (SPI 4-Wire)/Alternate I2C Address Select (I2C).", 13 SDA/SDI/SDIO (io) "Serial Data (I2C)/Serial Data Input (SPI 4-Wire)/Serial Data Input and Output (SPI 3-Wire).", 14 SCL/SCLK (in) "Serial Communications Clock. SCL is the clock for I2C, and SCLK is the clock for SPI."